# Altium footprint library ICs And Semiconductors THD.PcbLib: 350 footprints (part 15 of 22)
Each footprint in its own frame and in the unit in brackets; x right, y up, seen from the top. Pads: shape width x height; smd on the part's side, far side on the other; paste and mask are expansions set on the pad; w line width, h text height; cw(c..) or ccw(c..) is an arc to the next point about the centre after c.
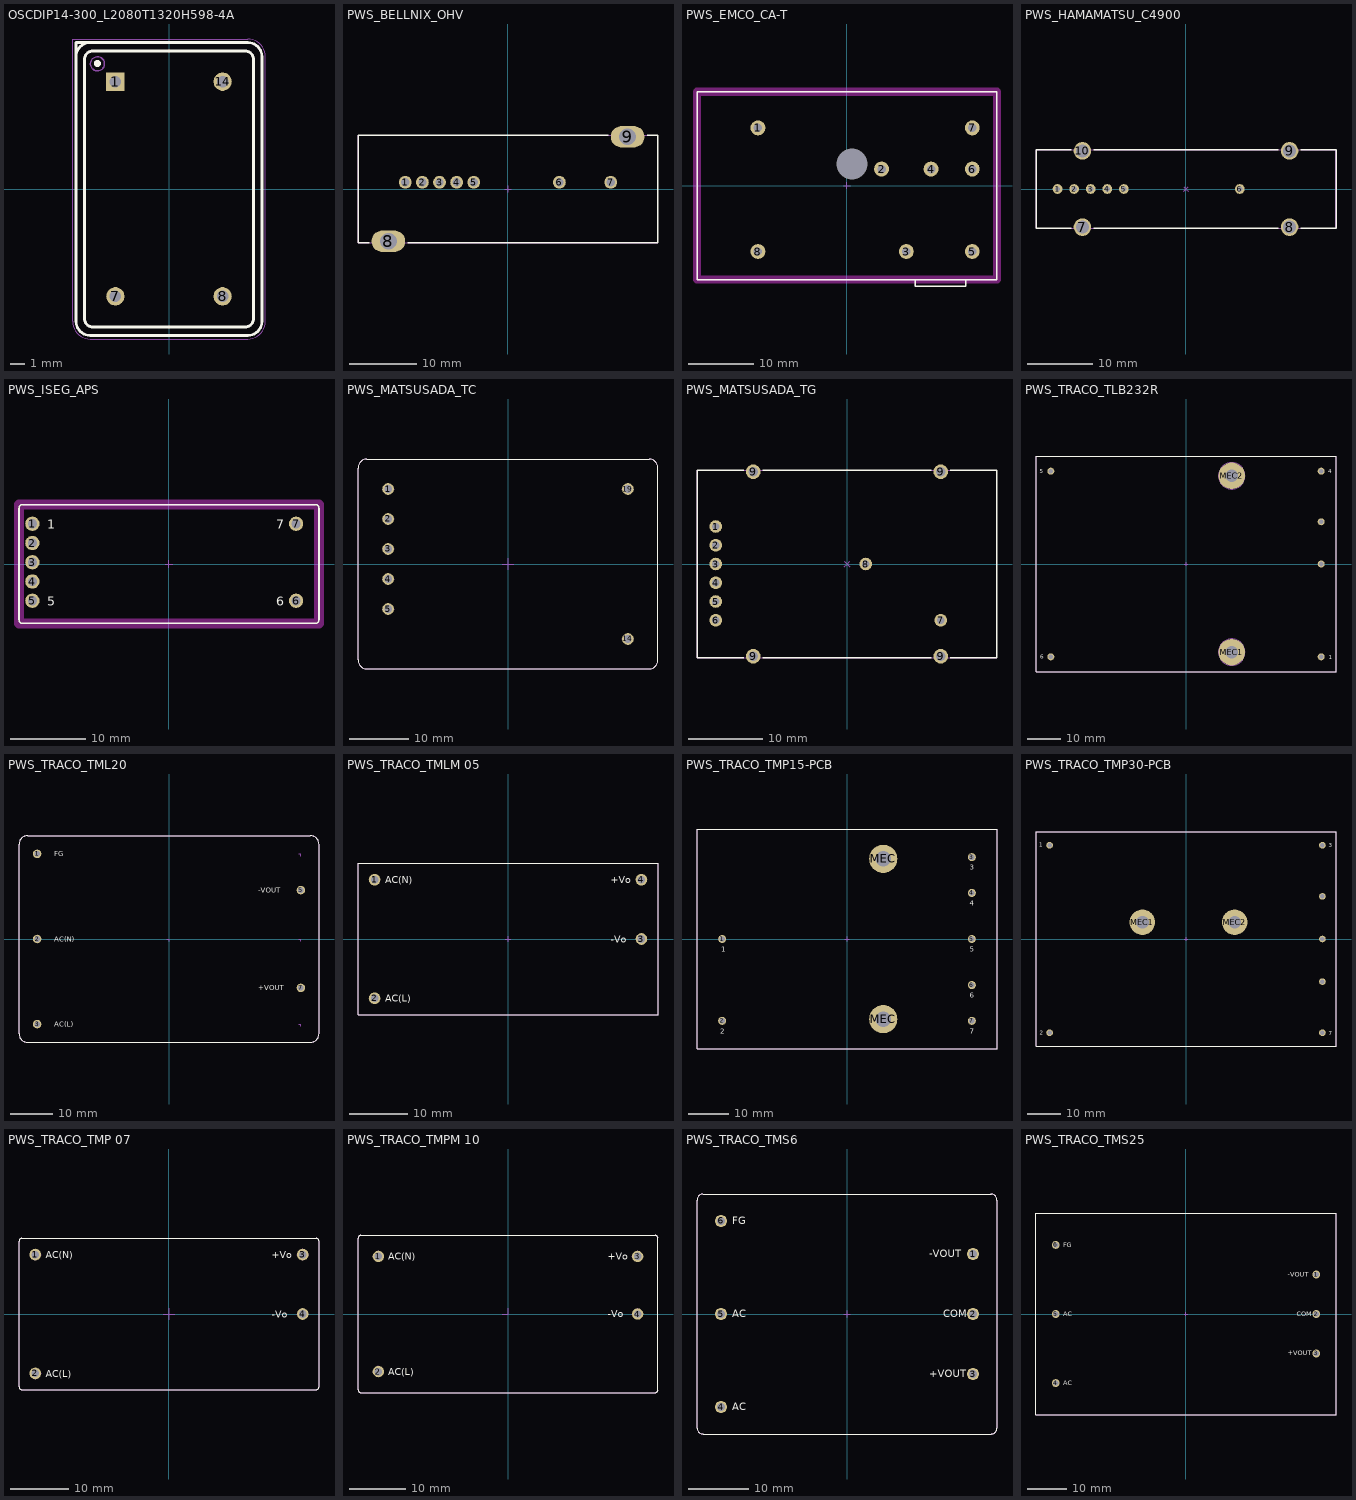
[diagram p14: the footprints below, top view; thin cyan lines are the x and y axes]

## OSCDIP14-300_L2080T1320H598-4A [mm] "Oscillator DIP 14 Leads, Row Spacing 7.62 mm; Pitch 2.54mm"
height 5.98
pads (4):
  rect 1.3x1.3 hole 0.8: 1(-3.81,7.62)
  round 1.3 hole 0.8: 7(-3.81,-7.62) 8(3.81,-7.62) 14(3.81,7.62)
Top Overlay:
  circle w0.25: c-5.081,8.911 r0.125
  lines w0.2: -6.6,9.4 cw(c-5.6,9.4) -5.6,10.4 ; -6.6,-9.4 ccw(c-5.6,-9.4) -5.6,-10.4 5.6,-10.4 ccw(c5.6,-9.4) 6.6,-9.4 6.6,9.4 ccw(c5.6,9.4) 5.6,10.4 -6.6,10.4 -6.6,-9.4 ; -6,-9.2 ccw(c-5.4,-9.2) -5.4,-9.8 5.4,-9.8 ccw(c5.4,-9.2) 6,-9.2 6,9.2 ccw(c5.4,9.2) 5.4,9.8 -5.4,9.8 ccw(c-5.4,9.2) -6,9.2 -6,-9.2
Mechanical 14:
  circle w0.1: c-5.08,8.89 r0.5
  lines w0.1: -6.6,9.4 cw(c-5.6,9.4) -5.6,10.4 ; -6.6,-9.4 ccw(c-5.6,-9.4) -5.6,-10.4 5.6,-10.4 ccw(c5.6,-9.4) 6.6,-9.4 6.6,9.4 ccw(c5.6,9.4) 5.6,10.4 -6.6,10.4 -6.6,-9.4 ; -6,-9.2 ccw(c-5.4,-9.2) -5.4,-9.8 5.4,-9.8 ccw(c5.4,-9.2) 6,-9.2 6,9.2 ccw(c5.4,9.2) 5.4,9.8 -5.4,9.8 ccw(c-5.4,9.2) -6,9.2 -6,-9.2
Mechanical 15:
  lines w0.05: -6.85,-9.4 ccw(c-5.6,-9.4) -5.6,-10.65 5.6,-10.65 ccw(c5.6,-9.4) 6.85,-9.4 6.85,9.4 ccw(c5.6,9.4) 5.6,10.65 -6.85,10.65 -6.85,-9.4
3D body "OSCDIP14-300_L2080T1320H598-4A.stp": height 5.98, standoff -3.6, extent -6.6,-10.4 6.6,10.4

## PWS_BELLNIX_OHV [mm] "BELLNIX OHV Series, Ultracompact, Adjustable Output High-Voltage Power Supply , Body 44x16mm"
height 30
pads (9):
  round 1.9 hole 1.2: 1(-15.24,1) 2(-12.7,1) 3(-10.16,1) 4(-7.62,1) 5(-5.08,1) 6(7.62,1) 7(15.24,1)
  oval 5x3.2 hole 2.5: 8(-17.75,-7.75) 9(17.75,7.75)
Top Overlay:
  lines w0.2: -20.6,-8 -22.25,-8 -22.25,8 14.863,8 ; -14.86,-8 22.25,-8 22.25,8 20.63,8
Notvisible:
  lines w0.1: -18.25,-7.75 -17.75,-7.75 ; -17.75,-8.25 -17.75,-7.75 ; -17.75,-7.25 -17.75,-7.75 ; -17.25,-7.75 -17.75,-7.75 ; -15.74,1 -15.24,1 ; -15.24,0.5 -15.24,1 ; -15.24,1.5 -15.24,1 ; -14.74,1 -15.24,1 ; -13.2,1 -12.7,1 ; -12.7,0.5 -12.7,1 ; -12.7,1.5 -12.7,1 ; -12.2,1 -12.7,1 ; -10.66,1 -10.16,1 ; -10.16,0.5 -10.16,1 ; -10.16,1.5 -10.16,1 ; -9.66,1 -10.16,1 ; -8.12,1 -7.62,1 ; -7.62,0.5 -7.62,1 ; -7.62,1.5 -7.62,1 ; -7.12,1 -7.62,1 ; -5.58,1 -5.08,1 ; -5.08,0.5 -5.08,1 ; -5.08,1.5 -5.08,1 ; -4.58,1 -5.08,1 ; -0.5,0 0,0 ; 0,-0.5 0,0 ; 0,0.5 0,0 ; 0.5,0 0,0 ; 7.12,1 7.62,1 ; 7.62,0.5 7.62,1 ; 7.62,1.5 7.62,1 ; 8.12,1 7.62,1 ; 14.74,1 15.24,1 ; 15.24,0.5 15.24,1 ; 15.24,1.5 15.24,1 ; 15.74,1 15.24,1 ; 17.25,7.75 17.75,7.75 ; 17.75,7.25 17.75,7.75 ; 17.75,8.25 17.75,7.75 ; 18.25,7.75 17.75,7.75
Mechanical 14:
  lines w0.1: -22.25,-8 22.25,-8 22.25,8 -22.25,8 -22.25,-8
3D body "PWS_BELLNIX_OHV.stp": height 30.5, standoff -4.6, extent -22.25,-8 22.25,8

## PWS_EMCO_CA-T [mm] "EMCO CA-T Series, High Performance, Precision Regulated, High-Voltage Power Supply , Body 45.72x28.45mm"
height 13.46
pads (9):
  round 2.3 hole 1.3: 1(-13.72,8.895) 2(5.33,2.545) 3(9.14,-10.155) 4(12.95,2.545) 5(19.3,-10.155) 6(19.3,2.545) 7(19.3,8.895) 8(-13.72,-10.155)
  round 1 hole 4.8 unplated mask+1.9: 9(0.76,3.305)
Top Layer keep-out:
  lines w1.27: -23.11,-14.475 23.11,-14.475 23.11,14.475 -23.11,14.475 -23.11,-14.475
Top Overlay:
  lines w0.2: 10.535,-14.475 10.535,-15.525 18.285,-15.525 18.285,-14.475 ; -23.11,-14.475 23.11,-14.475 23.11,14.475 -23.11,14.475 -23.11,-14.475
Notvisible:
  lines w0.1: -14.22,-10.155 -13.72,-10.155 ; -14.22,8.895 -13.72,8.895 ; -13.72,-10.655 -13.72,-10.155 ; -13.72,-9.655 -13.72,-10.155 ; -13.72,8.395 -13.72,8.895 ; -13.72,9.395 -13.72,8.895 ; -13.22,-10.155 -13.72,-10.155 ; -13.22,8.895 -13.72,8.895 ; -0.5,0 0,0 ; 0,-0.5 0,0 ; 0,0.5 0,0 ; 0.26,3.305 0.76,3.305 ; 0.5,0 0,0 ; 0.76,2.805 0.76,3.305 ; 0.76,3.805 0.76,3.305 ; 1.26,3.305 0.76,3.305 ; 4.83,2.545 5.33,2.545 ; 5.33,2.045 5.33,2.545 ; 5.33,3.045 5.33,2.545 ; 5.83,2.545 5.33,2.545 ; 8.64,-10.155 9.14,-10.155 ; 9.14,-10.655 9.14,-10.155 ; 9.14,-9.655 9.14,-10.155 ; 9.64,-10.155 9.14,-10.155 ; 12.45,2.545 12.95,2.545 ; 12.95,2.045 12.95,2.545 ; 12.95,3.045 12.95,2.545 ; 13.45,2.545 12.95,2.545 ; 18.8,-10.155 19.3,-10.155 ; 18.8,2.545 19.3,2.545 ; 18.8,8.895 19.3,8.895 ; 19.3,-10.655 19.3,-10.155 ; 19.3,-9.655 19.3,-10.155 ; 19.3,2.045 19.3,2.545 ; 19.3,3.045 19.3,2.545 ; 19.3,8.395 19.3,8.895 ; 19.3,9.395 19.3,8.895 ; 19.8,-10.155 19.3,-10.155 ; 19.8,2.545 19.3,2.545 ; 19.8,8.895 19.3,8.895
Mechanical 14:
  lines w0.1: 10.535,-14.475 10.535,-15.525 18.285,-15.525 18.285,-14.475 ; -23.11,-14.475 23.11,-14.475 23.11,14.475 -23.11,14.475 -23.11,-14.475
3D body "PWS_EMCO_CA-T.stp": height 13.46, standoff -3.6, extent -23.11,-15.525 23.11,14.475

## PWS_HAMAMATSU_C4900 [mm] "HAMAMATSU C4900 Series, High Voltage Power Supply , Body 46x12mm"
height 24.5
pads (10):
  round 1.5 hole 0.8: 1(-19.69,0) 2(-17.15,0) 3(-14.61,0) 4(-12.07,0) 5(-9.53,0) 6(8.25,0)
  round 2.7 hole 2: 7(-15.88,-5.85) 8(15.88,-5.85) 9(15.88,5.85) 10(-15.88,5.85)
Top Overlay:
  lines w0.2: -17.623,-6 -23,-6 -23,6 -17.623,6 ; -14.136,-6 14.137,-6 ; -14.136,6 14.137,6 ; 17.624,-6 23,-6 23,6 17.624,6
Notvisible:
  lines w0.1: -20.19,0 -19.69,0 ; -19.69,-0.5 -19.69,0 ; -19.69,0.5 -19.69,0 ; -19.19,0 -19.69,0 ; -17.65,0 -17.15,0 ; -17.15,-0.5 -17.15,0 ; -17.15,0.5 -17.15,0 ; -16.65,0 -17.15,0 ; -16.38,-5.85 -15.88,-5.85 ; -16.38,5.85 -15.88,5.85 ; -15.88,-6.35 -15.88,-5.85 ; -15.88,-5.35 -15.88,-5.85 ; -15.88,5.35 -15.88,5.85 ; -15.88,6.35 -15.88,5.85 ; -15.38,-5.85 -15.88,-5.85 ; -15.38,5.85 -15.88,5.85 ; -15.11,0 -14.61,0 ; -14.61,-0.5 -14.61,0 ; -14.61,0.5 -14.61,0 ; -14.11,0 -14.61,0 ; -12.57,0 -12.07,0 ; -12.07,-0.5 -12.07,0 ; -12.07,0.5 -12.07,0 ; -11.57,0 -12.07,0 ; -10.03,0 -9.53,0 ; -9.53,-0.5 -9.53,0 ; -9.53,0.5 -9.53,0 ; -9.03,0 -9.53,0 ; -0.354,-0.354 0,0 ; -0.354,0.354 0,0 ; 0.354,-0.354 0,0 ; 0.354,0.354 0,0 ; 7.75,0 8.25,0 ; 8.25,-0.5 8.25,0 ; 8.25,0.5 8.25,0 ; 8.75,0 8.25,0 ; 15.38,-5.85 15.88,-5.85 ; 15.38,5.85 15.88,5.85 ; 15.88,-6.35 15.88,-5.85 ; 15.88,-5.35 15.88,-5.85 ; 15.88,5.35 15.88,5.85 ; 15.88,6.35 15.88,5.85 ; 16.38,-5.85 15.88,-5.85 ; 16.38,5.85 15.88,5.85
Mechanical 14:
  lines w0.1: -23,-6 -23,6 23,6 23,-6 -23,-6
3D body "PWS_HAMAMATSU_C4900.stp": height 24.5, standoff -3.6, extent -23,-6 23,6

## PWS_ISEG_APS [mm] "Body 39.6x15.7mm, 1W High Voltage Power Supply APS-series"
height 11
pads (7):
  round 1.9 hole 1.2: 1(-18.03,5.31) 2(-18.03,2.77) 3(-18.03,0.23) 4(-18.03,-2.31) 5(-18.03,-4.85) 6(16.77,-4.85) 7(16.77,5.31)
Top Layer keep-out:
  lines w1.27: -19.8,-7.85 -19.8,7.85 19.8,7.85 19.8,-7.85 -19.8,-7.85
Top Overlay:
  lines w0.2: -19.8,-7.35 ccw(c-19.3,-7.35) -19.3,-7.85 19.3,-7.85 ccw(c19.3,-7.35) 19.8,-7.35 19.8,7.35 ccw(c19.3,7.35) 19.3,7.85 -19.3,7.85 ccw(c-19.3,7.35) -19.8,7.35 -19.8,-7.35
  text "6" at 14.16,-5.49 h1.2
  text "7" at 14.16,4.67 h1.2
  text "1" at -16.07,4.655 h1.2
  text "5" at -16.07,-5.505 h1.2
Notvisible:
  lines w0.1: -18.53,-4.85 -18.03,-4.85 ; -18.53,-2.31 -18.03,-2.31 ; -18.53,0.23 -18.03,0.23 ; -18.53,2.77 -18.03,2.77 ; -18.53,5.31 -18.03,5.31 ; -18.03,-5.35 -18.03,-4.85 ; -18.03,-4.35 -18.03,-4.85 ; -18.03,-2.81 -18.03,-2.31 ; -18.03,-1.81 -18.03,-2.31 ; -18.03,-0.27 -18.03,0.23 ; -18.03,0.73 -18.03,0.23 ; -18.03,2.27 -18.03,2.77 ; -18.03,3.27 -18.03,2.77 ; -18.03,4.81 -18.03,5.31 ; -18.03,5.81 -18.03,5.31 ; -17.53,-4.85 -18.03,-4.85 ; -17.53,-2.31 -18.03,-2.31 ; -17.53,0.23 -18.03,0.23 ; -17.53,2.77 -18.03,2.77 ; -17.53,5.31 -18.03,5.31 ; -0.5,0 0,0 ; 0,-0.5 0,0 ; 0,0.5 0,0 ; 0.5,0 0,0 ; 16.27,-4.85 16.77,-4.85 ; 16.27,5.31 16.77,5.31 ; 16.77,-5.35 16.77,-4.85 ; 16.77,-4.35 16.77,-4.85 ; 16.77,4.81 16.77,5.31 ; 16.77,5.81 16.77,5.31 ; 17.27,-4.85 16.77,-4.85 ; 17.27,5.31 16.77,5.31
Mechanical 14:
  lines w0.1: -19.8,-7.35 ccw(c-19.3,-7.35) -19.3,-7.85 19.3,-7.85 ccw(c19.3,-7.35) 19.8,-7.35 19.8,7.35 ccw(c19.3,7.35) 19.3,7.85 -19.3,7.85 ccw(c-19.3,7.35) -19.8,7.35 -19.8,-7.35
  text "6" at 14.16,-5.49 h1.2
  text "7" at 14.16,4.67 h1.2
  text "1" at -16.07,4.655 h1.2
  text "5" at -16.07,-5.505 h1.2
3D body "PWS_ISEG_APS.stp": height 11, standoff -2.2, extent -19.8,-7.85 19.8,7.85

## PWS_MATSUSADA_TC [mm] "TC Serie, Body 50.8x35.5mm, High Voltage Power Supply"
height 16.2
pads (7):
  round 2 hole 1.3: 1(-20.3,12.7) 2(-20.3,7.62) 3(-20.3,2.54) 4(-20.3,-2.54) 5(-20.3,-7.62) 14(20.3,-12.7) 19(20.3,12.7)
Top Overlay:
  lines w0.2: -25.4,-16.25 ccw(c-23.9,-16.25) -23.9,-17.75 23.9,-17.75 ccw(c23.9,-16.25) 25.4,-16.25 25.4,16.25 ccw(c23.9,16.25) 23.9,17.75 -23.9,17.75 ccw(c-23.9,16.25) -25.4,16.25 -25.4,-16.25
Notvisible:
  lines w0.1: -21.3,-7.62 -20.3,-7.62 ; -21.3,-2.54 -20.3,-2.54 ; -21.3,2.54 -20.3,2.54 ; -21.3,7.62 -20.3,7.62 ; -21.3,12.7 -20.3,12.7 ; -20.3,-8.62 -20.3,-7.62 ; -20.3,-6.62 -20.3,-7.62 ; -20.3,-3.54 -20.3,-2.54 ; -20.3,-1.54 -20.3,-2.54 ; -20.3,1.54 -20.3,2.54 ; -20.3,3.54 -20.3,2.54 ; -20.3,6.62 -20.3,7.62 ; -20.3,8.62 -20.3,7.62 ; -20.3,11.7 -20.3,12.7 ; -20.3,13.7 -20.3,12.7 ; -19.3,-7.62 -20.3,-7.62 ; -19.3,-2.54 -20.3,-2.54 ; -19.3,2.54 -20.3,2.54 ; -19.3,7.62 -20.3,7.62 ; -19.3,12.7 -20.3,12.7 ; -1,0 0,0 ; 0,-1 0,0 ; 0,1 0,0 ; 1,0 0,0 ; 19.3,-12.7 20.3,-12.7 ; 19.3,12.7 20.3,12.7 ; 20.3,-13.7 20.3,-12.7 ; 20.3,-11.7 20.3,-12.7 ; 20.3,11.7 20.3,12.7 ; 20.3,13.7 20.3,12.7 ; 21.3,-12.7 20.3,-12.7 ; 21.3,12.7 20.3,12.7
Mechanical 14:
  lines w0.1: -25.4,-16.25 ccw(c-23.9,-16.25) -23.9,-17.75 23.9,-17.75 ccw(c23.9,-16.25) 25.4,-16.25 25.4,16.25 ccw(c23.9,16.25) 23.9,17.75 -23.9,17.75 ccw(c-23.9,16.25) -25.4,16.25 -25.4,-16.25
3D body "PWS_MATSUSADA_TC.stp": height 16.2, standoff -3.6, extent -25.4,-17.75 25.4,17.75

## PWS_MATSUSADA_TG [mm] "TG Serie, Body 40.64x25.4mm, PMT High Voltage Power Supply"
height 12.3
pads (12):
  round 1.7 hole 1: 1(-17.78,5.08) 2(-17.78,2.54) 3(-17.78,0) 4(-17.78,-2.54) 5(-17.78,-5.08) 6(-17.78,-7.62) 7(12.7,-7.62) 8(2.54,0)
  round 2 hole 1.3: 9(-12.7,-12.5) 9(-12.7,12.5) 9(12.7,-12.5) 9(12.7,12.5)
Top Overlay:
  lines w0.2: -13.985,-12.7 -20.32,-12.7 -20.32,12.7 -13.985,12.7 ; -11.415,-12.7 11.415,-12.7 ; -11.415,12.7 11.415,12.7 ; 13.985,-12.7 20.32,-12.7 20.32,12.7 13.985,12.7
Notvisible:
  lines w0.1: -18.28,-7.62 -17.78,-7.62 ; -18.28,-5.08 -17.78,-5.08 ; -18.28,-2.54 -17.78,-2.54 ; -18.28,0 -17.78,0 ; -18.28,2.54 -17.78,2.54 ; -18.28,5.08 -17.78,5.08 ; -17.78,-8.12 -17.78,-7.62 ; -17.78,-7.12 -17.78,-7.62 ; -17.78,-5.58 -17.78,-5.08 ; -17.78,-4.58 -17.78,-5.08 ; -17.78,-3.04 -17.78,-2.54 ; -17.78,-2.04 -17.78,-2.54 ; -17.78,-0.5 -17.78,0 ; -17.78,0.5 -17.78,0 ; -17.78,2.04 -17.78,2.54 ; -17.78,3.04 -17.78,2.54 ; -17.78,4.58 -17.78,5.08 ; -17.78,5.58 -17.78,5.08 ; -17.28,-7.62 -17.78,-7.62 ; -17.28,-5.08 -17.78,-5.08 ; -17.28,-2.54 -17.78,-2.54 ; -17.28,0 -17.78,0 ; -17.28,2.54 -17.78,2.54 ; -17.28,5.08 -17.78,5.08 ; -13.2,-12.5 -12.7,-12.5 ; -13.2,12.5 -12.7,12.5 ; -12.7,-13 -12.7,-12.5 ; -12.7,-12 -12.7,-12.5 ; -12.7,12 -12.7,12.5 ; -12.7,13 -12.7,12.5 ; -12.2,-12.5 -12.7,-12.5 ; -12.2,12.5 -12.7,12.5 ; -0.354,-0.354 0,0 ; -0.354,0.354 0,0 ; 0.354,-0.354 0,0 ; 0.354,0.354 0,0 ; 2.04,0 2.54,0 ; 2.54,-0.5 2.54,0 ; 2.54,0.5 2.54,0 ; 3.04,0 2.54,0 ; 12.2,-12.5 12.7,-12.5 ; 12.2,-7.62 12.7,-7.62 ; 12.2,12.5 12.7,12.5 ; 12.7,-13 12.7,-12.5 ; 12.7,-12 12.7,-12.5 ; 12.7,-8.12 12.7,-7.62 ; 12.7,-7.12 12.7,-7.62 ; 12.7,12 12.7,12.5 ; 12.7,13 12.7,12.5 ; 13.2,-12.5 12.7,-12.5 ; 13.2,-7.62 12.7,-7.62 ; 13.2,12.5 12.7,12.5
Mechanical 14:
  lines w0.1: -20.32,-12.7 20.32,-12.7 20.32,12.7 -20.32,12.7 -20.32,-12.7
3D body "PWS_MATSUSADA_TG.stp": height 12.3, standoff -3, extent -20.32,-12.7 20.32,12.7

## PWS_TRACO_TLB232R [mm] "TLB Model For PCB Mount, Body 89x64mm"
height 40.5
pads (8):
  round 2.1 hole 1.4: 1(40.65,-27.9) 2(40.65,0) 3(40.65,12.7) 4(40.65,27.9) 5(-40.65,27.9) 6(-40.65,-27.9)
  round 8 hole 3.8: MEC1(13.75,-26.5) MEC2(13.75,26.5)
Top Overlay:
  lines w0.2: -45.1,-32.35 45.1,-32.35 45.1,32.35 -45.1,32.35 -45.1,-32.35
  text "1" at 42.93,-28.61 h1.2
  text "4" at 42.83,27.265 h1.2
  text "6" at -43.77,-28.48 h1.2
  text "5" at -43.97,27.31 h1.2
Notvisible:
  circle w0.1: c-40.65,27.9 r0.5
  circle w0.1: c-40.65,-27.9 r0.5
  circle w0.1: c13.75,-26.5 r1.5
  circle w0.1: c40.65,-27.9 r0.5
  circle w0.1: c40.65,0 r0.5
  circle w0.1: c40.65,12.7 r0.5
  circle w0.1: c40.65,27.9 r0.5
  circle w0.1: c13.75,-26.5 r4
  circle w0.1: c13.75,26.5 r1.5
  circle w0.1: c13.75,26.5 r4
  lines w0.1: -41.15,-27.9 -40.65,-27.9 ; -41.15,27.9 -40.65,27.9 ; -40.65,-28.4 -40.65,-27.9 ; -40.65,-27.4 -40.65,-27.9 ; -40.65,27.4 -40.65,27.9 ; -40.65,28.4 -40.65,27.9 ; -40.15,-27.9 -40.65,-27.9 ; -40.15,27.9 -40.65,27.9 ; -0.5,0 0,0 ; 0,-0.5 0,0 ; 0,0.5 0,0 ; 0.5,0 0,0 ; 13.25,-26.5 13.75,-26.5 ; 13.25,26.5 13.75,26.5 ; 13.75,-27 13.75,-26.5 ; 13.75,-26 13.75,-26.5 ; 13.75,26 13.75,26.5 ; 13.75,27 13.75,26.5 ; 14.25,-26.5 13.75,-26.5 ; 14.25,26.5 13.75,26.5 ; 40.15,-27.9 40.65,-27.9 ; 40.15,0 40.65,0 ; 40.15,12.7 40.65,12.7 ; 40.15,27.9 40.65,27.9 ; 40.65,-28.4 40.65,-27.9 ; 40.65,-27.4 40.65,-27.9 ; 40.65,-0.5 40.65,0 ; 40.65,0.5 40.65,0 ; 40.65,12.2 40.65,12.7 ; 40.65,13.2 40.65,12.7 ; 40.65,27.4 40.65,27.9 ; 40.65,28.4 40.65,27.9 ; 41.15,-27.9 40.65,-27.9 ; 41.15,0 40.65,0 ; 41.15,12.7 40.65,12.7 ; 41.15,27.9 40.65,27.9
Mechanical 14:
  lines w0.1: 45.1,-27.85 45.1,-32.35 ; 45.1,-32.35 45.1,32.35 -45.1,32.35 -45.1,-32.35 45.1,-32.35
  text "1" at 42.93,-28.61 h1.2
  text "4" at 42.83,27.265 h1.2
  text "6" at -43.77,-28.48 h1.2
  text "5" at -43.97,27.31 h1.2
3D body "PWS_TRACO_TLB232R.stp": height 40.25, standoff -6.3, extent -45.1,-32.35 45.1,32.35

## PWS_TRACO_TML20 [mm] "TML 20 Single Output Series , Body 70.5x48.5mm, Power Supply"
height 22.5
pads (5):
  round 2 hole 1.3: 1(-31,20) 2(-31,0) 3(-31,-20) 5(31,11.5) 7(31,-11.5)
Top Overlay:
  lines w0.2: -35.25,-22.25 ccw(c-33.25,-22.25) -33.25,-24.25 33.25,-24.25 ccw(c33.25,-22.25) 35.25,-22.25 35.25,22.25 ccw(c33.25,22.25) 33.25,24.25 -33.25,24.25 ccw(c-33.25,22.25) -35.25,22.25 -35.25,-22.25
  text "FG" at -27,19.4 h1.2
  text "AC(N)" at -27,-0.6 h1.2
  text "AC(L)" at -27,-20.6 h1.2
  text "+VOUT" at 21,-12.1 h1.2
  text "-VOUT" at 21,10.9 h1.2
Notvisible:
  lines w0.05: -31.5,-20 -31,-20 -31,-20.5 ; -31.5,0 -31,0 -31,-0.5 ; -31.5,20 -31,20 -31,19.5 ; -0.5,0 0,0 0,-0.5 ; 30.5,-20 31,-20 31,-20.5 ; 30.5,-11.5 31,-11.5 31,-12 ; 30.5,0 31,0 31,-0.5 ; 30.5,11.5 31,11.5 31,11 ; 30.5,20 31,20 31,19.5
  text "4" at 26,19.4 h1.2
  text "6" at 26,-0.6 h1.2
  text "8" at 26,-20.6 h1.2
Mechanical 14:
  lines w0.1: -35.25,-22.25 ccw(c-33.25,-22.25) -33.25,-24.25 33.25,-24.25 ccw(c33.25,-22.25) 35.25,-22.25 35.25,22.25 ccw(c33.25,22.25) 33.25,24.25 -33.25,24.25 ccw(c-33.25,22.25) -35.25,22.25 -35.25,-22.25
  text "-VOUT" at 21,10.9 h1.2
  text "+VOUT" at 21,-12.1 h1.2
  text "AC(L)" at -27,-20.6 h1.2
  text "AC(N)" at -27,-0.6 h1.2
  text "FG" at -27,19.4 h1.2
3D body "PWS_TRACO_TML20.stp": height 22.5, standoff -3.1, extent -35.25,-24.25 35.25,24.25

## PWS_TRACO_TMLM 05 [mm] "TMLM 05 Series , Body 50.9x25.5mm, Power Supply"
height 15.66
pads (4):
  round 2 hole 1.3: 1(-22.86,10.16) 2(-22.86,-10.16) 3(22.86,0) 4(22.86,10.16)
Top Overlay:
  lines w0.2: -25.7,-13 25.7,-13 25.7,13 -25.7,13 -25.7,-13
  text "AC(N)" at -21.073,9.527 h1.2
  text "+Vo" at 17.585,9.55 h1.2
  text "-Vo" at 17.585,-0.61 h1.2
  text "AC(L)" at -21.073,-10.793 h1.2
Notvisible:
  lines w0.1: -23.36,-10.16 -22.86,-10.16 ; -23.36,10.16 -22.86,10.16 ; -22.86,-10.66 -22.86,-10.16 ; -22.86,-9.66 -22.86,-10.16 ; -22.86,9.66 -22.86,10.16 ; -22.86,10.66 -22.86,10.16 ; -22.36,-10.16 -22.86,-10.16 ; -22.36,10.16 -22.86,10.16 ; -0.5,0 0,0 ; 0,-0.5 0,0 ; 0,0.5 0,0 ; 0.5,0 0,0 ; 22.36,0 22.86,0 ; 22.36,10.16 22.86,10.16 ; 22.86,-0.5 22.86,0 ; 22.86,0.5 22.86,0 ; 22.86,9.66 22.86,10.16 ; 22.86,10.66 22.86,10.16 ; 23.36,0 22.86,0 ; 23.36,10.16 22.86,10.16
Mechanical 14:
  lines w0.1: -25.7,-13 25.7,-13 25.7,13 -25.7,13 -25.7,-13
  text "-Vo" at 17.585,-0.61 h1.2
  text "+Vo" at 17.585,9.55 h1.2
  text "AC(N)" at -21.073,9.527 h1.2
  text "AC(L)" at -21.073,-10.793 h1.2
3D body "PWS_TRACO_TMLM 05.stp": height 15.75, standoff -3.8, extent -25.7,-13 25.7,13

## PWS_TRACO_TMP15-PCB [mm] "TMP15 Model For PCB Mount, Body 74x54mm"
height 19.8
pads (9):
  round 2 hole 1.3: 1(-31,0) 2(-31,-20.32) 3(31,20.32) 4(31,11.43) 5(31,0) 6(31,-11.43) 7(31,-20.32)
  round 7 hole 3.8: MEC(9,-19.9) MEC(9,19.9)
Top Overlay:
  lines w0.2: -37.25,-27.25 37.25,-27.25 37.25,27.25 -37.25,27.25 -37.25,-27.25
  text "3" at 30.53,17.16 h1.27
  text "1" at -31.27,-3.16 h1.27
  text "2" at -31.47,-23.48 h1.27
  text "6" at 30.53,-14.59 h1.27
  text "7" at 30.53,-23.48 h1.27
  text "5" at 30.53,-3.16 h1.27
  text "4" at 30.53,8.27 h1.27
Notvisible:
  lines w0.1: -31.5,-20.32 -31,-20.32 ; -31.5,0 -31,0 ; -31,-20.82 -31,-20.32 ; -31,-19.82 -31,-20.32 ; -31,-0.5 -31,0 ; -31,0.5 -31,0 ; -30.5,-20.32 -31,-20.32 ; -30.5,0 -31,0 ; -0.5,0 0,0 ; 0,-0.5 0,0 ; 0,0.5 0,0 ; 0.5,0 0,0 ; 8.5,-19.9 9,-19.9 ; 8.5,19.9 9,19.9 ; 9,-20.4 9,-19.9 ; 9,-19.4 9,-19.9 ; 9,19.4 9,19.9 ; 9,20.4 9,19.9 ; 9.5,-19.9 9,-19.9 ; 9.5,19.9 9,19.9 ; 30.5,-20.32 31,-20.32 ; 30.5,-11.43 31,-11.43 ; 30.5,0 31,0 ; 30.5,11.43 31,11.43 ; 30.5,20.32 31,20.32 ; 31,-20.82 31,-20.32 ; 31,-19.82 31,-20.32 ; 31,-11.93 31,-11.43 ; 31,-10.93 31,-11.43 ; 31,-0.5 31,0 ; 31,0.5 31,0 ; 31,10.93 31,11.43 ; 31,11.93 31,11.43 ; 31,19.82 31,20.32 ; 31,20.82 31,20.32 ; 31.5,-20.32 31,-20.32 ; 31.5,-11.43 31,-11.43 ; 31.5,0 31,0 ; 31.5,11.43 31,11.43 ; 31.5,20.32 31,20.32
Mechanical 14:
  lines w0.1: -37.25,-27.25 37.25,-27.25 37.25,27.25 -37.25,27.25 -37.25,-27.25
  text "3" at 30.53,17.16 h1.27
  text "1" at -31.27,-3.16 h1.27
  text "2" at -31.47,-23.48 h1.27
  text "6" at 30.53,-14.59 h1.27
  text "7" at 30.53,-23.48 h1.27
  text "5" at 30.53,-3.16 h1.27
  text "4" at 30.53,8.27 h1.27
3D body "PWS_TRACO_TMP15-PCB.stp": height 19.85, standoff -4.3, extent -37.25,-27.25 37.25,27.25

## PWS_TRACO_TMP30-PCB [mm] "TPM  30W Model For PCB Mount, Body 88.9x63.5mm"
height 22
pads (9):
  round 2 hole 1.3: 1(-40.65,27.94) 2(-40.65,-27.94) 3(40.65,27.94) 4(40.65,12.7) 5(40.65,0) 6(40.65,-12.7) 7(40.65,-27.94)
  round 7.6 hole 3.8: MEC1(-13,5) MEC2(14.5,5)
Top Overlay:
  lines w0.2: -44.7,-32 44.7,-32 44.7,32 -44.7,32 -44.7,-32
  text "3" at 42.48,27.365 h1.2
  text "2" at -43.52,-28.605 h1.2
  text "1" at -43.72,27.46 h1.2
  text "7" at 42.58,-28.71 h1.2
Notvisible:
  lines w0.1: -41.15,-27.94 -40.65,-27.94 ; -41.15,27.94 -40.65,27.94 ; -40.65,-28.44 -40.65,-27.94 ; -40.65,-27.44 -40.65,-27.94 ; -40.65,27.44 -40.65,27.94 ; -40.65,28.44 -40.65,27.94 ; -40.15,-27.94 -40.65,-27.94 ; -40.15,27.94 -40.65,27.94 ; -13.5,5 -13,5 ; -13,4.5 -13,5 ; -13,5.5 -13,5 ; -12.5,5 -13,5 ; -0.5,0 0,0 ; 0,-0.5 0,0 ; 0,0.5 0,0 ; 0.5,0 0,0 ; 14,5 14.5,5 ; 14.5,4.5 14.5,5 ; 14.5,5.5 14.5,5 ; 15,5 14.5,5 ; 40.15,-27.94 40.65,-27.94 ; 40.15,-12.7 40.65,-12.7 ; 40.15,0 40.65,0 ; 40.15,12.7 40.65,12.7 ; 40.15,27.94 40.65,27.94 ; 40.65,-28.44 40.65,-27.94 ; 40.65,-27.44 40.65,-27.94 ; 40.65,-13.2 40.65,-12.7 ; 40.65,-12.2 40.65,-12.7 ; 40.65,-0.5 40.65,0 ; 40.65,0.5 40.65,0 ; 40.65,12.2 40.65,12.7 ; 40.65,13.2 40.65,12.7 ; 40.65,27.44 40.65,27.94 ; 40.65,28.44 40.65,27.94 ; 41.15,-27.94 40.65,-27.94 ; 41.15,-12.7 40.65,-12.7 ; 41.15,0 40.65,0 ; 41.15,12.7 40.65,12.7 ; 41.15,27.94 40.65,27.94
Mechanical 14:
  lines w0.1: -44.7,-32 44.7,-32 44.7,32 -44.7,32 -44.7,-32
  text "3" at 42.48,27.365 h1.2
  text "2" at -43.52,-28.605 h1.2
  text "1" at -43.72,27.46 h1.2
  text "7" at 42.58,-28.71 h1.2
3D body "PWS_TRACO_TMP30-PCB.stp": height 22, standoff -3.6, extent -44.7,-32 44.7,32

## PWS_TRACO_TMP 07 [mm] "TMPM 07 Series, Body 50.8x25.4mm, Power Supply"
height 19.8
pads (4):
  round 2 hole 1.3: 1(-22.86,10.16) 2(-22.86,-10.16) 3(22.86,10.16) 4(22.86,0)
Top Overlay:
  lines w0.2: -25.65,-12.45 ccw(c-25.15,-12.45) -25.15,-12.95 25.15,-12.95 ccw(c25.15,-12.45) 25.65,-12.45 25.65,12.45 ccw(c25.15,12.45) 25.15,12.95 -25.15,12.95 ccw(c-25.15,12.45) -25.65,12.45 -25.65,-12.45
  text "-Vo" at 17.585,-0.61 h1.2
  text "+Vo" at 17.585,9.55 h1.2
  text "AC(L)" at -21.073,-10.793 h1.2
  text "AC(N)" at -21.073,9.527 h1.2
Notvisible:
  lines w0.1: -22.86,-11.16 -22.86,-10.16 -21.86,-10.16 ; -22.86,9.16 -22.86,10.16 -21.86,10.16 ; -1,0 0,0 ; 0,-1 0,0 ; 0,1 0,0 ; 1,0 0,0 ; 21.86,0 22.86,0 ; 21.86,10.16 22.86,10.16 ; 22.86,-1 22.86,0 ; 22.86,1 22.86,0 ; 22.86,9.16 22.86,10.16 ; 22.86,11.16 22.86,10.16 ; 23.86,0 22.86,0 ; 23.86,10.16 22.86,10.16
  lines w0.2: 21.86,0 22.86,0
Mechanical 14:
  lines w0.1: -25.65,-12.45 ccw(c-25.15,-12.45) -25.15,-12.95 25.15,-12.95 ccw(c25.15,-12.45) 25.65,-12.45 25.65,12.45 ccw(c25.15,12.45) 25.15,12.95 -25.15,12.95 ccw(c-25.15,12.45) -25.65,12.45 -25.65,-12.45
  text "-Vo" at 17.585,-0.61 h1.2
  text "+Vo" at 17.585,9.55 h1.2
  text "AC(L)" at -21.073,-10.793 h1.2
  text "AC(N)" at -21.073,9.527 h1.2
3D body "PWS_TRACO_TMP 07.stp": height 19.8, standoff -3.1, extent -25.65,-12.95 25.65,12.95

## PWS_TRACO_TMPM 10 [mm] "TMPM 10 Series, Body 52.4x27.2mm, Power Supply"
height 24
pads (4):
  round 2 hole 1.3: 1(-22.86,10.16) 2(-22.86,-10.16) 3(22.86,10.16) 4(22.86,0)
Top Overlay:
  lines w0.2: -26.45,-13.35 ccw(c-25.95,-13.35) -25.95,-13.85 25.95,-13.85 ccw(c25.95,-13.35) 26.45,-13.35 26.45,13.35 ccw(c25.95,13.35) 25.95,13.85 -25.95,13.85 ccw(c-25.95,13.35) -26.45,13.35 -26.45,-13.35
  text "AC(N)" at -21.073,9.527 h1.2
  text "+Vo" at 17.585,9.55 h1.2
  text "-Vo" at 17.585,-0.61 h1.2
  text "AC(L)" at -21.073,-10.793 h1.2
Notvisible:
  lines w0.2: -23.86,-10.16 -22.86,-10.16 -22.86,-9.16 ; -23.86,10.16 -22.86,10.16 -22.86,11.16 ; -1,0 0,0 0,1 ; 21.86,0 22.86,0 22.86,1 ; 21.86,10.16 22.86,10.16 22.86,11.16
  text "3" at 24.765,9.525 h1.2
  text "4" at 24.765,-0.635 h1.2
  text "2" at -25.4,-10.795 h1.2
  text "1" at -25.4,9.527 h1.2
Mechanical 14:
  lines w0.1: -26.45,-13.35 ccw(c-25.95,-13.35) -25.95,-13.85 25.95,-13.85 ccw(c25.95,-13.35) 26.45,-13.35 26.45,13.35 ccw(c25.95,13.35) 25.95,13.85 -25.95,13.85 ccw(c-25.95,13.35) -26.45,13.35 -26.45,-13.35
  text "-Vo" at 17.585,-0.61 h1.2
  text "+Vo" at 17.585,9.55 h1.2
  text "AC(N)" at -21.073,9.527 h1.2
  text "AC(L)" at -21.073,-10.793 h1.2
3D body "PWS_TRACO_TMPM 10.stp": height 24, standoff -3.1, extent -26.45,-13.85 26.45,13.85

## PWS_TRACO_TMS6 [mm] "TMS 6 Series , Body 50x40mm, Height 20mm"
height 20
pads (6):
  round 2 hole 1.3: 1(21,10) 2(21,0) 3(21,-10) 4(-21,-15.5) 5(-21,0) 6(-21,15.5)
Top Overlay:
  lines w0.2: -25,-19 ccw(c-24,-19) -24,-20 24,-20 ccw(c24,-19) 25,-19 25,19 ccw(c24,19) 24,20 -24,20 ccw(c-24,19) -25,19 -25,-19
  text "AC" at -19.125,-16.05 h1.2
  text "AC" at -19.125,-0.55 h1.2
  text "FG" at -19.125,14.95 h1.2
  text "+VOUT" at 13.719,-10.505 h1.2
  text "COM" at 16.025,-0.55 h1.2
  text "-VOUT" at 13.719,9.495 h1.2
Notvisible:
  lines w0.1: -21.5,-15.5 -21,-15.5 ; -21.5,0 -21,0 ; -21.5,15.5 -21,15.5 ; -21,-16 -21,-15.5 ; -21,-15 -21,-15.5 ; -21,-0.5 -21,0 ; -21,0.5 -21,0 ; -21,15 -21,15.5 ; -21,16 -21,15.5 ; -20.5,-15.5 -21,-15.5 ; -20.5,0 -21,0 ; -20.5,15.5 -21,15.5 ; -0.5,0 0,0 ; 0,-0.5 0,0 ; 0,0.5 0,0 ; 0.5,0 0,0 ; 20.5,-10 21,-10 ; 20.5,0 21,0 ; 20.5,10 21,10 ; 21,-10.5 21,-10 ; 21,-9.5 21,-10 ; 21,-0.5 21,0 ; 21,0.5 21,0 ; 21,9.5 21,10 ; 21,10.5 21,10 ; 21.5,-10 21,-10 ; 21.5,0 21,0 ; 21.5,10 21,10
Mechanical 14:
  lines w0.1: -25,-19 ccw(c-24,-19) -24,-20 24,-20 ccw(c24,-19) 25,-19 25,19 ccw(c24,19) 24,20 -24,20 ccw(c-24,19) -25,19 -25,-19
  text "-VOUT" at 13.719,9.495 h1.2
  text "COM" at 16.025,-0.55 h1.2
  text "+VOUT" at 13.719,-10.505 h1.2
  text "FG" at -19.125,14.95 h1.2
  text "AC" at -19.125,-0.55 h1.2
  text "AC" at -19.125,-16.05 h1.2
3D body "PWS_TRACO_TMS6.stp": height 20.1, standoff -3.6, extent -25,-20 25,20

## PWS_TRACO_TMS25 [mm] "TMS 25 Series , Body 76x51mm, Height 28mm"
height 28
pads (6):
  round 2 hole 1.3: 1(33,10) 2(33,0) 3(33,-10) 4(-33,-17.5) 5(-33,0) 6(-33,17.5)
Top Overlay:
  lines w0.2: -38,-25.5 -38,25.5 38,25.5 38,-25.5 -38,-25.5
  text "-VOUT" at 25.719,9.495 h1.2
  text "COM" at 28.025,-0.55 h1.2
  text "+VOUT" at 25.719,-10.505 h1.2
  text "FG" at -31.125,16.95 h1.2
  text "AC" at -31.125,-0.55 h1.2
  text "AC" at -31.125,-18.05 h1.2
Notvisible:
  lines w0.1: -33.5,-17.5 -33,-17.5 ; -33.5,0 -33,0 ; -33.5,17.5 -33,17.5 ; -33,-18 -33,-17.5 ; -33,-17 -33,-17.5 ; -33,-0.5 -33,0 ; -33,0.5 -33,0 ; -33,17 -33,17.5 ; -33,18 -33,17.5 ; -32.5,-17.5 -33,-17.5 ; -32.5,0 -33,0 ; -32.5,17.5 -33,17.5 ; -0.5,0 0,0 ; 0,-0.5 0,0 ; 0,0.5 0,0 ; 0.5,0 0,0 ; 32.5,-10 33,-10 ; 32.5,0 33,0 ; 32.5,10 33,10 ; 33,-10.5 33,-10 ; 33,-9.5 33,-10 ; 33,-0.5 33,0 ; 33,0.5 33,0 ; 33,9.5 33,10 ; 33,10.5 33,10 ; 33.5,-10 33,-10 ; 33.5,0 33,0 ; 33.5,10 33,10
Mechanical 14:
  lines w0.1: -38,-25.5 -38,25.5 38,25.5 38,-25.5 -38,-25.5
  text "-VOUT" at 25.719,9.495 h1.2
  text "COM" at 28.025,-0.55 h1.2
  text "+VOUT" at 25.719,-10.505 h1.2
  text "FG" at -31.125,16.95 h1.2
  text "AC" at -31.125,-0.55 h1.2
  text "AC" at -31.125,-18.05 h1.2
3D body "PWS_TRACO_TMS25.stp": height 28, standoff -3.6, extent -38,-25.5 38,25.5